# Altium schematic symbol library jlcpcb_2025_04_capacitors_extended_1206.schlib: 2503 symbols (part 7 of 14) (continued)
## CC1206KKX7RBBB222
designator C?  Capacitance: 2.2nF  (hidden comment: *)
Capacitor, Ceramic (MLCC), 2.2nF, ±10%, 500V, X7R, ±10%, SMD 1206; Manufacturer: YAGEO; Manufacturer Part Number: CC1206KKX7RBBB222; Package Size: 1206; JLCPCB Basic Part: No; JLCPCB Part Number: C107188; Supplier 1: LCSC; Category: Capacitors - MLCC; Supplier Part Number 1: C107188; Tolerance: ±10%; Voltage Rating: 500V; Temperature Coefficient: X7R; RoHS: Yes; ComponentLink1Description: Datasheet; ComponentLink1URL: https://wmsc.lcsc.com/wmsc/upload/file/pdf/v2/lcsc/2304140030_YAGEO-CC1206KKX7RBBB222_C107188.pdf; ComponentLink2Description: JLCPCB Part URL; ComponentLink2URL: https://jlcpcb.com/partdetail/C107188; ComponentLink3Description: LCSC Part URL; ComponentLink3URL: https://lcsc.com/product-detail/Multilayer-Ceramic-Capacitors-MLCC---SMD-SMT_YAGEO-YAGEO-CC1206KKX7RBBB222_C107188.html
footprint CAP-1206 (1206 (3216M) Capacitor)
pins: 1, 2

## CC1206KKX7RBBB223
designator C?  Capacitance: 22nF  (hidden comment: *)
Capacitor, Ceramic (MLCC), 22nF, ±10%, 500V, X7R, ±10%, SMD 1206; Manufacturer: YAGEO; Manufacturer Part Number: CC1206KKX7RBBB223; Package Size: 1206; JLCPCB Basic Part: No; JLCPCB Part Number: C326702; Supplier 1: LCSC; Category: Capacitors - MLCC; Supplier Part Number 1: C326702; Tolerance: ±10%; Voltage Rating: 500V; Temperature Coefficient: X7R; RoHS: Yes; ComponentLink1Description: Datasheet; ComponentLink1URL: https://wmsc.lcsc.com/wmsc/upload/file/pdf/v2/lcsc/1811141240_YAGEO-CC1206KKX7RBBB223_C326702.pdf; ComponentLink2Description: JLCPCB Part URL; ComponentLink2URL: https://jlcpcb.com/partdetail/C326702; ComponentLink3Description: LCSC Part URL; ComponentLink3URL: https://lcsc.com/product-detail/Multilayer-Ceramic-Capacitors-MLCC---SMD-SMT_YAGEO-YAGEO-CC1206KKX7RBBB223_C326702.html
footprint CAP-1206 (1206 (3216M) Capacitor)
pins: 1, 2

## CC1206KKX7RBBB331
designator C?  Capacitance: 330pF  (hidden comment: *)
Capacitor, Ceramic (MLCC), 330pF, ±10%, 500V, X7R, ±10%, SMD 1206; Manufacturer: YAGEO; Manufacturer Part Number: CC1206KKX7RBBB331; Package Size: 1206; JLCPCB Basic Part: No; JLCPCB Part Number: C113896; Supplier 1: LCSC; Category: Capacitors - MLCC; Supplier Part Number 1: C113896; Tolerance: ±10%; Voltage Rating: 500V; Temperature Coefficient: X7R; RoHS: Yes; ComponentLink1Description: Datasheet; ComponentLink1URL: https://wmsc.lcsc.com/wmsc/upload/file/pdf/v2/lcsc/2304140030_YAGEO-CC1206KKX7RBBB331_C113896.pdf; ComponentLink2Description: JLCPCB Part URL; ComponentLink2URL: https://jlcpcb.com/partdetail/C113896; ComponentLink3Description: LCSC Part URL; ComponentLink3URL: https://lcsc.com/product-detail/Multilayer-Ceramic-Capacitors-MLCC---SMD-SMT_YAGEO-YAGEO-CC1206KKX7RBBB331_C113896.html
footprint CAP-1206 (1206 (3216M) Capacitor)
pins: 1, 2

## CC1206KKX7RBBB332
designator C?  Capacitance: 3.3nF  (hidden comment: *)
Capacitor, Ceramic (MLCC), 3.3nF, ±10%, 500V, X7R, ±10%, SMD 1206; Manufacturer: YAGEO; Manufacturer Part Number: CC1206KKX7RBBB332; Package Size: 1206; JLCPCB Basic Part: No; JLCPCB Part Number: C113897; Supplier 1: LCSC; Category: Capacitors - MLCC; Supplier Part Number 1: C113897; Tolerance: ±10%; Voltage Rating: 500V; Temperature Coefficient: X7R; RoHS: Yes; ComponentLink1Description: Datasheet; ComponentLink1URL: https://wmsc.lcsc.com/wmsc/upload/file/pdf/v2/lcsc/2304140030_YAGEO-CC1206KKX7RBBB332_C113897.pdf; ComponentLink2Description: JLCPCB Part URL; ComponentLink2URL: https://jlcpcb.com/partdetail/C113897; ComponentLink3Description: LCSC Part URL; ComponentLink3URL: https://lcsc.com/product-detail/Multilayer-Ceramic-Capacitors-MLCC---SMD-SMT_YAGEO-YAGEO-CC1206KKX7RBBB332_C113897.html
footprint CAP-1206 (1206 (3216M) Capacitor)
pins: 1, 2

## CC1206KKX7RBBB333
designator C?  Capacitance: 33nF  (hidden comment: *)
Capacitor, Ceramic (MLCC), 33nF, ±10%, 500V, X7R, ±10%, SMD 1206; Manufacturer: YAGEO; Manufacturer Part Number: CC1206KKX7RBBB333; Package Size: 1206; JLCPCB Basic Part: No; JLCPCB Part Number: C107189; Supplier 1: LCSC; Category: Capacitors - MLCC; Supplier Part Number 1: C107189; Tolerance: ±10%; Voltage Rating: 500V; Temperature Coefficient: X7R; RoHS: Yes; ComponentLink1Description: Datasheet; ComponentLink1URL: https://wmsc.lcsc.com/wmsc/upload/file/pdf/v2/lcsc/2304140030_YAGEO-CC1206KKX7RBBB333_C107189.pdf; ComponentLink2Description: JLCPCB Part URL; ComponentLink2URL: https://jlcpcb.com/partdetail/C107189; ComponentLink3Description: LCSC Part URL; ComponentLink3URL: https://lcsc.com/product-detail/Multilayer-Ceramic-Capacitors-MLCC---SMD-SMT_YAGEO-YAGEO-CC1206KKX7RBBB333_C107189.html
footprint CAP-1206 (1206 (3216M) Capacitor)
pins: 1, 2

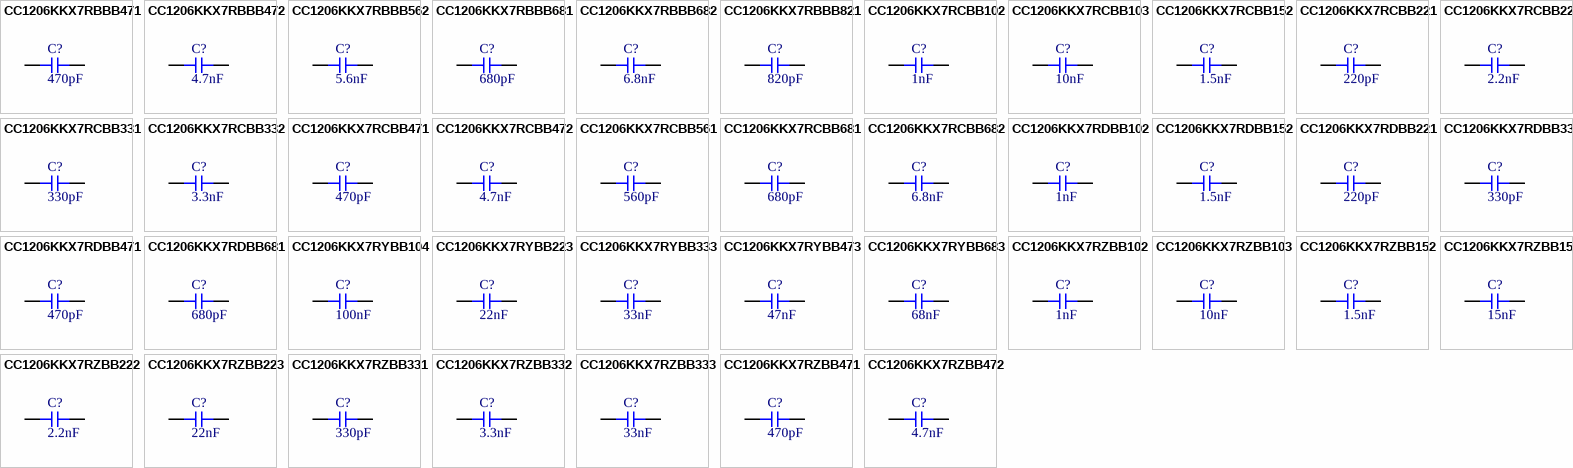
[diagram p31: symbols CC1206KKX7RBBB471 to CC1206KKX7RZBB472]

## CC1206KKX7RBBB471
designator C?  Capacitance: 470pF  (hidden comment: *)
Capacitor, Ceramic (MLCC), 470pF, ±10%, 500V, X7R, ±10%, SMD 1206; Manufacturer: YAGEO; Manufacturer Part Number: CC1206KKX7RBBB471; Package Size: 1206; JLCPCB Basic Part: No; JLCPCB Part Number: C513662; Supplier 1: LCSC; Category: Capacitors - MLCC; Supplier Part Number 1: C513662; Tolerance: ±10%; Voltage Rating: 500V; Temperature Coefficient: X7R; RoHS: Yes; ComponentLink1Description: Datasheet; ComponentLink1URL: https://wmsc.lcsc.com/wmsc/upload/file/pdf/v2/lcsc/2004231433_YAGEO-CC1206KKX7RBBB471_C513662.pdf; ComponentLink2Description: JLCPCB Part URL; ComponentLink2URL: https://jlcpcb.com/partdetail/C513662; ComponentLink3Description: LCSC Part URL; ComponentLink3URL: https://lcsc.com/product-detail/Multilayer-Ceramic-Capacitors-MLCC---SMD-SMT_YAGEO-YAGEO-CC1206KKX7RBBB471_C513662.html
footprint CAP-1206 (1206 (3216M) Capacitor)
pins: 1, 2

## CC1206KKX7RBBB472
designator C?  Capacitance: 4.7nF  (hidden comment: *)
Capacitor, Ceramic (MLCC), 4.7nF, ±10%, 500V, X7R, ±10%, SMD 1206; Manufacturer: YAGEO; Manufacturer Part Number: CC1206KKX7RBBB472; Package Size: 1206; JLCPCB Basic Part: No; JLCPCB Part Number: C107190; Supplier 1: LCSC; Category: Capacitors - MLCC; Supplier Part Number 1: C107190; Tolerance: ±10%; Voltage Rating: 500V; Temperature Coefficient: X7R; RoHS: Yes; ComponentLink1Description: Datasheet; ComponentLink1URL: https://wmsc.lcsc.com/wmsc/upload/file/pdf/v2/lcsc/2304140030_YAGEO-CC1206KKX7RBBB472_C107190.pdf; ComponentLink2Description: JLCPCB Part URL; ComponentLink2URL: https://jlcpcb.com/partdetail/C107190; ComponentLink3Description: LCSC Part URL; ComponentLink3URL: https://lcsc.com/product-detail/Multilayer-Ceramic-Capacitors-MLCC---SMD-SMT_YAGEO-YAGEO-CC1206KKX7RBBB472_C107190.html
footprint CAP-1206 (1206 (3216M) Capacitor)
pins: 1, 2

## CC1206KKX7RBBB562
designator C?  Capacitance: 5.6nF  (hidden comment: *)
Capacitor, Ceramic (MLCC), 5.6nF, ±10%, 500V, X7R, ±10%, SMD 1206; Manufacturer: YAGEO; Manufacturer Part Number: CC1206KKX7RBBB562; Package Size: 1206; JLCPCB Basic Part: No; JLCPCB Part Number: C3834562; Supplier 1: LCSC; Category: Capacitors - MLCC; Supplier Part Number 1: C3834562; Tolerance: ±10%; Voltage Rating: 500V; Temperature Coefficient: X7R; RoHS: Yes; ComponentLink1Description: Datasheet; ComponentLink1URL: https://wmsc.lcsc.com/wmsc/upload/file/pdf/v2/lcsc/2311211121_YAGEO-CC1206KKX7RBBB562_C3834562.pdf; ComponentLink2Description: JLCPCB Part URL; ComponentLink2URL: https://jlcpcb.com/partdetail/C3834562; ComponentLink3Description: LCSC Part URL; ComponentLink3URL: https://lcsc.com/product-detail/Multilayer-Ceramic-Capacitors-MLCC---SMD-SMT_YAGEO-YAGEO-CC1206KKX7RBBB562_C3834562.html
footprint CAP-1206 (1206 (3216M) Capacitor)
pins: 1, 2

## CC1206KKX7RBBB681
designator C?  Capacitance: 680pF  (hidden comment: *)
Capacitor, Ceramic (MLCC), 680pF, ±10%, 500V, X7R, ±10%, SMD 1206; Manufacturer: YAGEO; Manufacturer Part Number: CC1206KKX7RBBB681; Package Size: 1206; JLCPCB Basic Part: No; JLCPCB Part Number: C326771; Supplier 1: LCSC; Category: Capacitors - MLCC; Supplier Part Number 1: C326771; Tolerance: ±10%; Voltage Rating: 500V; Temperature Coefficient: X7R; RoHS: Yes; ComponentLink1Description: Datasheet; ComponentLink1URL: https://wmsc.lcsc.com/wmsc/upload/file/pdf/v2/lcsc/1811141241_YAGEO-CC1206KKX7RBBB681_C326771.pdf; ComponentLink2Description: JLCPCB Part URL; ComponentLink2URL: https://jlcpcb.com/partdetail/C326771; ComponentLink3Description: LCSC Part URL; ComponentLink3URL: https://lcsc.com/product-detail/Multilayer-Ceramic-Capacitors-MLCC---SMD-SMT_YAGEO-YAGEO-CC1206KKX7RBBB681_C326771.html
footprint CAP-1206 (1206 (3216M) Capacitor)
pins: 1, 2

## CC1206KKX7RBBB682
designator C?  Capacitance: 6.8nF  (hidden comment: *)
Capacitor, Ceramic (MLCC), 6.8nF, ±10%, 500V, X7R, ±10%, SMD 1206; Manufacturer: YAGEO; Manufacturer Part Number: CC1206KKX7RBBB682; Package Size: 1206; JLCPCB Basic Part: No; JLCPCB Part Number: C577221; Supplier 1: LCSC; Category: Capacitors - MLCC; Supplier Part Number 1: C577221; Tolerance: ±10%; Voltage Rating: 500V; Temperature Coefficient: X7R; RoHS: Yes; ComponentLink1Description: Datasheet; ComponentLink1URL: https://wmsc.lcsc.com/wmsc/upload/file/pdf/v2/lcsc/2304140030_YAGEO-CC1206KKX7RBBB682_C577221.pdf; ComponentLink2Description: JLCPCB Part URL; ComponentLink2URL: https://jlcpcb.com/partdetail/C577221; ComponentLink3Description: LCSC Part URL; ComponentLink3URL: https://lcsc.com/product-detail/Multilayer-Ceramic-Capacitors-MLCC---SMD-SMT_YAGEO-YAGEO-CC1206KKX7RBBB682_C577221.html
footprint CAP-1206 (1206 (3216M) Capacitor)
pins: 1, 2

## CC1206KKX7RBBB821
designator C?  Capacitance: 820pF  (hidden comment: *)
Capacitor, Ceramic (MLCC), 820pF, ±10%, 500V, X7R, ±10%, SMD 1206; Manufacturer: YAGEO; Manufacturer Part Number: CC1206KKX7RBBB821; Package Size: 1206; JLCPCB Basic Part: No; JLCPCB Part Number: C326993; Supplier 1: LCSC; Category: Capacitors - MLCC; Supplier Part Number 1: C326993; Tolerance: ±10%; Voltage Rating: 500V; Temperature Coefficient: X7R; RoHS: Yes; ComponentLink1Description: Datasheet; ComponentLink1URL: https://wmsc.lcsc.com/wmsc/upload/file/pdf/v2/lcsc/2311211121_YAGEO-CC1206KKX7RBBB821_C326993.pdf; ComponentLink2Description: JLCPCB Part URL; ComponentLink2URL: https://jlcpcb.com/partdetail/C326993; ComponentLink3Description: LCSC Part URL; ComponentLink3URL: https://lcsc.com/product-detail/Multilayer-Ceramic-Capacitors-MLCC---SMD-SMT_YAGEO-YAGEO-CC1206KKX7RBBB821_C326993.html
footprint CAP-1206 (1206 (3216M) Capacitor)
pins: 1, 2

## CC1206KKX7RCBB102
designator C?  Capacitance: 1nF  (hidden comment: *)
Capacitor, Ceramic (MLCC), 1nF, ±10%, 1kV, X7R, ±10%, SMD 1206; Manufacturer: YAGEO; Manufacturer Part Number: CC1206KKX7RCBB102; Package Size: 1206; JLCPCB Basic Part: No; JLCPCB Part Number: C107191; Supplier 1: LCSC; Category: Capacitors - MLCC; Supplier Part Number 1: C107191; Tolerance: ±10%; Voltage Rating: 1kV; Temperature Coefficient: X7R; RoHS: Yes; ComponentLink1Description: Datasheet; ComponentLink1URL: https://wmsc.lcsc.com/wmsc/upload/file/pdf/v2/lcsc/2304140030_YAGEO-CC1206KKX7RCBB102_C107191.pdf; ComponentLink2Description: JLCPCB Part URL; ComponentLink2URL: https://jlcpcb.com/partdetail/C107191; ComponentLink3Description: LCSC Part URL; ComponentLink3URL: https://lcsc.com/product-detail/Multilayer-Ceramic-Capacitors-MLCC---SMD-SMT_YAGEO-YAGEO-CC1206KKX7RCBB102_C107191.html
footprint CAP-1206 (1206 (3216M) Capacitor)
pins: 1, 2

## CC1206KKX7RCBB103
designator C?  Capacitance: 10nF  (hidden comment: *)
Capacitor, Ceramic (MLCC), 10nF, ±10%, 1kV, X7R, ±10%, SMD 1206; Manufacturer: YAGEO; Manufacturer Part Number: CC1206KKX7RCBB103; Package Size: 1206; JLCPCB Basic Part: No; JLCPCB Part Number: C107192; Supplier 1: LCSC; Category: Capacitors - MLCC; Supplier Part Number 1: C107192; Tolerance: ±10%; Voltage Rating: 1kV; Temperature Coefficient: X7R; RoHS: Yes; ComponentLink1Description: Datasheet; ComponentLink1URL: https://wmsc.lcsc.com/wmsc/upload/file/pdf/v2/lcsc/2304140030_YAGEO-CC1206KKX7RCBB103_C107192.pdf; ComponentLink2Description: JLCPCB Part URL; ComponentLink2URL: https://jlcpcb.com/partdetail/C107192; ComponentLink3Description: LCSC Part URL; ComponentLink3URL: https://lcsc.com/product-detail/Multilayer-Ceramic-Capacitors-MLCC---SMD-SMT_YAGEO-YAGEO-CC1206KKX7RCBB103_C107192.html
footprint CAP-1206 (1206 (3216M) Capacitor)
pins: 1, 2

## CC1206KKX7RCBB152
designator C?  Capacitance: 1.5nF  (hidden comment: *)
Capacitor, Ceramic (MLCC), 1.5nF, ±10%, 1kV, X7R, ±10%, SMD 1206; Manufacturer: YAGEO; Manufacturer Part Number: CC1206KKX7RCBB152; Package Size: 1206; JLCPCB Basic Part: No; JLCPCB Part Number: C513659; Supplier 1: LCSC; Category: Capacitors - MLCC; Supplier Part Number 1: C513659; Tolerance: ±10%; Voltage Rating: 1kV; Temperature Coefficient: X7R; RoHS: Yes; ComponentLink1Description: Datasheet; ComponentLink1URL: https://wmsc.lcsc.com/wmsc/upload/file/pdf/v2/lcsc/2005142208_YAGEO-CC1206KKX7RCBB152_C513659.pdf; ComponentLink2Description: JLCPCB Part URL; ComponentLink2URL: https://jlcpcb.com/partdetail/C513659; ComponentLink3Description: LCSC Part URL; ComponentLink3URL: https://lcsc.com/product-detail/Multilayer-Ceramic-Capacitors-MLCC---SMD-SMT_YAGEO-YAGEO-CC1206KKX7RCBB152_C513659.html
footprint CAP-1206 (1206 (3216M) Capacitor)
pins: 1, 2

## CC1206KKX7RCBB221
designator C?  Capacitance: 220pF  (hidden comment: *)
Capacitor, Ceramic (MLCC), 220pF, ±10%, 1kV, X7R, ±10%, SMD 1206; Manufacturer: YAGEO; Manufacturer Part Number: CC1206KKX7RCBB221; Package Size: 1206; JLCPCB Basic Part: No; JLCPCB Part Number: C107193; Supplier 1: LCSC; Category: Capacitors - MLCC; Supplier Part Number 1: C107193; Tolerance: ±10%; Voltage Rating: 1kV; Temperature Coefficient: X7R; RoHS: Yes; ComponentLink1Description: Datasheet; ComponentLink1URL: https://wmsc.lcsc.com/wmsc/upload/file/pdf/v2/lcsc/2304140030_YAGEO-CC1206KKX7RCBB221_C107193.pdf; ComponentLink2Description: JLCPCB Part URL; ComponentLink2URL: https://jlcpcb.com/partdetail/C107193; ComponentLink3Description: LCSC Part URL; ComponentLink3URL: https://lcsc.com/product-detail/Multilayer-Ceramic-Capacitors-MLCC---SMD-SMT_YAGEO-YAGEO-CC1206KKX7RCBB221_C107193.html
footprint CAP-1206 (1206 (3216M) Capacitor)
pins: 1, 2

## CC1206KKX7RCBB222
designator C?  Capacitance: 2.2nF  (hidden comment: *)
Capacitor, Ceramic (MLCC), 2.2nF, ±10%, 1kV, X7R, ±10%, SMD 1206; Manufacturer: YAGEO; Manufacturer Part Number: CC1206KKX7RCBB222; Package Size: 1206; JLCPCB Basic Part: No; JLCPCB Part Number: C107194; Supplier 1: LCSC; Category: Capacitors - MLCC; Supplier Part Number 1: C107194; Tolerance: ±10%; Voltage Rating: 1kV; Temperature Coefficient: X7R; RoHS: Yes; ComponentLink1Description: Datasheet; ComponentLink1URL: https://wmsc.lcsc.com/wmsc/upload/file/pdf/v2/lcsc/2304140030_YAGEO-CC1206KKX7RCBB222_C107194.pdf; ComponentLink2Description: JLCPCB Part URL; ComponentLink2URL: https://jlcpcb.com/partdetail/C107194; ComponentLink3Description: LCSC Part URL; ComponentLink3URL: https://lcsc.com/product-detail/Multilayer-Ceramic-Capacitors-MLCC---SMD-SMT_YAGEO-YAGEO-CC1206KKX7RCBB222_C107194.html
footprint CAP-1206 (1206 (3216M) Capacitor)
pins: 1, 2

## CC1206KKX7RCBB331
designator C?  Capacitance: 330pF  (hidden comment: *)
Capacitor, Ceramic (MLCC), 330pF, ±10%, 1kV, X7R, ±10%, SMD 1206; Manufacturer: YAGEO; Manufacturer Part Number: CC1206KKX7RCBB331; Package Size: 1206; JLCPCB Basic Part: No; JLCPCB Part Number: C107195; Supplier 1: LCSC; Category: Capacitors - MLCC; Supplier Part Number 1: C107195; Tolerance: ±10%; Voltage Rating: 1kV; Temperature Coefficient: X7R; RoHS: Yes; ComponentLink1Description: Datasheet; ComponentLink1URL: https://wmsc.lcsc.com/wmsc/upload/file/pdf/v2/lcsc/2304140030_YAGEO-CC1206KKX7RCBB331_C107195.pdf; ComponentLink2Description: JLCPCB Part URL; ComponentLink2URL: https://jlcpcb.com/partdetail/C107195; ComponentLink3Description: LCSC Part URL; ComponentLink3URL: https://lcsc.com/product-detail/Multilayer-Ceramic-Capacitors-MLCC---SMD-SMT_YAGEO-YAGEO-CC1206KKX7RCBB331_C107195.html
footprint CAP-1206 (1206 (3216M) Capacitor)
pins: 1, 2

## CC1206KKX7RCBB332
designator C?  Capacitance: 3.3nF  (hidden comment: *)
Capacitor, Ceramic (MLCC), 3.3nF, ±10%, 1kV, X7R, ±10%, SMD 1206; Manufacturer: YAGEO; Manufacturer Part Number: CC1206KKX7RCBB332; Package Size: 1206; JLCPCB Basic Part: No; JLCPCB Part Number: C107196; Supplier 1: LCSC; Category: Capacitors - MLCC; Supplier Part Number 1: C107196; Tolerance: ±10%; Voltage Rating: 1kV; Temperature Coefficient: X7R; RoHS: Yes; ComponentLink1Description: Datasheet; ComponentLink1URL: https://wmsc.lcsc.com/wmsc/upload/file/pdf/v2/lcsc/2304140030_YAGEO-CC1206KKX7RCBB332_C107196.pdf; ComponentLink2Description: JLCPCB Part URL; ComponentLink2URL: https://jlcpcb.com/partdetail/C107196; ComponentLink3Description: LCSC Part URL; ComponentLink3URL: https://lcsc.com/product-detail/Multilayer-Ceramic-Capacitors-MLCC---SMD-SMT_YAGEO-YAGEO-CC1206KKX7RCBB332_C107196.html
footprint CAP-1206 (1206 (3216M) Capacitor)
pins: 1, 2

## CC1206KKX7RCBB471
designator C?  Capacitance: 470pF  (hidden comment: *)
Capacitor, Ceramic (MLCC), 470pF, ±10%, 1kV, X7R, ±10%, SMD 1206; Manufacturer: YAGEO; Manufacturer Part Number: CC1206KKX7RCBB471; Package Size: 1206; JLCPCB Basic Part: No; JLCPCB Part Number: C107197; Supplier 1: LCSC; Category: Capacitors - MLCC; Supplier Part Number 1: C107197; Tolerance: ±10%; Voltage Rating: 1kV; Temperature Coefficient: X7R; RoHS: Yes; ComponentLink1Description: Datasheet; ComponentLink1URL: https://wmsc.lcsc.com/wmsc/upload/file/pdf/v2/lcsc/2304140030_YAGEO-CC1206KKX7RCBB471_C107197.pdf; ComponentLink2Description: JLCPCB Part URL; ComponentLink2URL: https://jlcpcb.com/partdetail/C107197; ComponentLink3Description: LCSC Part URL; ComponentLink3URL: https://lcsc.com/product-detail/Multilayer-Ceramic-Capacitors-MLCC---SMD-SMT_YAGEO-YAGEO-CC1206KKX7RCBB471_C107197.html
footprint CAP-1206 (1206 (3216M) Capacitor)
pins: 1, 2

## CC1206KKX7RCBB472
designator C?  Capacitance: 4.7nF  (hidden comment: *)
Capacitor, Ceramic (MLCC), 4.7nF, ±10%, 1kV, X7R, ±10%, SMD 1206; Manufacturer: YAGEO; Manufacturer Part Number: CC1206KKX7RCBB472; Package Size: 1206; JLCPCB Basic Part: No; JLCPCB Part Number: C107198; Supplier 1: LCSC; Category: Capacitors - MLCC; Supplier Part Number 1: C107198; Tolerance: ±10%; Voltage Rating: 1kV; Temperature Coefficient: X7R; RoHS: Yes; ComponentLink1Description: Datasheet; ComponentLink1URL: https://wmsc.lcsc.com/wmsc/upload/file/pdf/v2/lcsc/2304140030_YAGEO-CC1206KKX7RCBB472_C107198.pdf; ComponentLink2Description: JLCPCB Part URL; ComponentLink2URL: https://jlcpcb.com/partdetail/C107198; ComponentLink3Description: LCSC Part URL; ComponentLink3URL: https://lcsc.com/product-detail/Multilayer-Ceramic-Capacitors-MLCC---SMD-SMT_YAGEO-YAGEO-CC1206KKX7RCBB472_C107198.html
footprint CAP-1206 (1206 (3216M) Capacitor)
pins: 1, 2

## CC1206KKX7RCBB561
designator C?  Capacitance: 560pF  (hidden comment: *)
Capacitor, Ceramic (MLCC), 560pF, ±10%, 1kV, X7R, ±10%, SMD 1206; Manufacturer: YAGEO; Manufacturer Part Number: CC1206KKX7RCBB561; Package Size: 1206; JLCPCB Basic Part: No; JLCPCB Part Number: C113898; Supplier 1: LCSC; Category: Capacitors - MLCC; Supplier Part Number 1: C113898; Tolerance: ±10%; Voltage Rating: 1kV; Temperature Coefficient: X7R; RoHS: Yes; ComponentLink1Description: Datasheet; ComponentLink1URL: https://wmsc.lcsc.com/wmsc/upload/file/pdf/v2/lcsc/2304140030_YAGEO-CC1206KKX7RCBB561_C113898.pdf; ComponentLink2Description: JLCPCB Part URL; ComponentLink2URL: https://jlcpcb.com/partdetail/C113898; ComponentLink3Description: LCSC Part URL; ComponentLink3URL: https://lcsc.com/product-detail/Multilayer-Ceramic-Capacitors-MLCC---SMD-SMT_YAGEO-YAGEO-CC1206KKX7RCBB561_C113898.html
footprint CAP-1206 (1206 (3216M) Capacitor)
pins: 1, 2

## CC1206KKX7RCBB681
designator C?  Capacitance: 680pF  (hidden comment: *)
Capacitor, Ceramic (MLCC), 680pF, ±10%, 1kV, X7R, ±10%, SMD 1206; Manufacturer: YAGEO; Manufacturer Part Number: CC1206KKX7RCBB681; Package Size: 1206; JLCPCB Basic Part: No; JLCPCB Part Number: C107199; Supplier 1: LCSC; Category: Capacitors - MLCC; Supplier Part Number 1: C107199; Tolerance: ±10%; Voltage Rating: 1kV; Temperature Coefficient: X7R; RoHS: Yes; ComponentLink1Description: Datasheet; ComponentLink1URL: https://wmsc.lcsc.com/wmsc/upload/file/pdf/v2/lcsc/2304140030_YAGEO-CC1206KKX7RCBB681_C107199.pdf; ComponentLink2Description: JLCPCB Part URL; ComponentLink2URL: https://jlcpcb.com/partdetail/C107199; ComponentLink3Description: LCSC Part URL; ComponentLink3URL: https://lcsc.com/product-detail/Multilayer-Ceramic-Capacitors-MLCC---SMD-SMT_YAGEO-YAGEO-CC1206KKX7RCBB681_C107199.html
footprint CAP-1206 (1206 (3216M) Capacitor)
pins: 1, 2

## CC1206KKX7RCBB682
designator C?  Capacitance: 6.8nF  (hidden comment: *)
Capacitor, Ceramic (MLCC), 6.8nF, ±10%, 1kV, X7R, ±10%, SMD 1206; Manufacturer: YAGEO; Manufacturer Part Number: CC1206KKX7RCBB682; Package Size: 1206; JLCPCB Basic Part: No; JLCPCB Part Number: C107200; Supplier 1: LCSC; Category: Capacitors - MLCC; Supplier Part Number 1: C107200; Tolerance: ±10%; Voltage Rating: 1kV; Temperature Coefficient: X7R; RoHS: Yes; ComponentLink1Description: Datasheet; ComponentLink1URL: https://wmsc.lcsc.com/wmsc/upload/file/pdf/v2/lcsc/2304140030_YAGEO-CC1206KKX7RCBB682_C107200.pdf; ComponentLink2Description: JLCPCB Part URL; ComponentLink2URL: https://jlcpcb.com/partdetail/C107200; ComponentLink3Description: LCSC Part URL; ComponentLink3URL: https://lcsc.com/product-detail/Multilayer-Ceramic-Capacitors-MLCC---SMD-SMT_YAGEO-YAGEO-CC1206KKX7RCBB682_C107200.html
footprint CAP-1206 (1206 (3216M) Capacitor)
pins: 1, 2

## CC1206KKX7RDBB102
designator C?  Capacitance: 1nF  (hidden comment: *)
Capacitor, Ceramic (MLCC), 1nF, ±10%, 2kV, X7R, ±10%, SMD 1206; Manufacturer: YAGEO; Manufacturer Part Number: CC1206KKX7RDBB102; Package Size: 1206; JLCPCB Basic Part: No; JLCPCB Part Number: C23631; Supplier 1: LCSC; Category: Capacitors - MLCC; Supplier Part Number 1: C23631; Tolerance: ±10%; Voltage Rating: 2kV; Temperature Coefficient: X7R; RoHS: Yes; ComponentLink1Description: Datasheet; ComponentLink1URL: https://wmsc.lcsc.com/wmsc/upload/file/pdf/v2/lcsc/2304140030_YAGEO-CC1206KKX7RDBB102_C23631.pdf; ComponentLink2Description: JLCPCB Part URL; ComponentLink2URL: https://jlcpcb.com/partdetail/C23631; ComponentLink3Description: LCSC Part URL; ComponentLink3URL: https://lcsc.com/product-detail/Multilayer-Ceramic-Capacitors-MLCC---SMD-SMT_YAGEO-YAGEO-CC1206KKX7RDBB102_C23631.html
footprint CAP-1206 (1206 (3216M) Capacitor)
pins: 1, 2

## CC1206KKX7RDBB152
designator C?  Capacitance: 1.5nF  (hidden comment: *)
Capacitor, Ceramic (MLCC), 1.5nF, ±10%, 2kV, X7R, ±10%, SMD 1206; Manufacturer: YAGEO; Manufacturer Part Number: CC1206KKX7RDBB152; Package Size: 1206; JLCPCB Basic Part: No; JLCPCB Part Number: C527335; Supplier 1: LCSC; Category: Capacitors - MLCC; Supplier Part Number 1: C527335; Tolerance: ±10%; Voltage Rating: 2kV; Temperature Coefficient: X7R; RoHS: Yes; ComponentLink1Description: Datasheet; ComponentLink1URL: https://wmsc.lcsc.com/wmsc/upload/file/pdf/v2/lcsc/2005262135_YAGEO-CC1206KKX7RDBB152_C527335.pdf; ComponentLink2Description: JLCPCB Part URL; ComponentLink2URL: https://jlcpcb.com/partdetail/C527335; ComponentLink3Description: LCSC Part URL; ComponentLink3URL: https://lcsc.com/product-detail/Multilayer-Ceramic-Capacitors-MLCC---SMD-SMT_YAGEO-YAGEO-CC1206KKX7RDBB152_C527335.html
footprint CAP-1206 (1206 (3216M) Capacitor)
pins: 1, 2

## CC1206KKX7RDBB221
designator C?  Capacitance: 220pF  (hidden comment: *)
Capacitor, Ceramic (MLCC), 220pF, ±10%, 2kV, X7R, ±10%, SMD 1206; Manufacturer: YAGEO; Manufacturer Part Number: CC1206KKX7RDBB221; Package Size: 1206; JLCPCB Basic Part: No; JLCPCB Part Number: C527336; Supplier 1: LCSC; Category: Capacitors - MLCC; Supplier Part Number 1: C527336; Tolerance: ±10%; Voltage Rating: 2kV; Temperature Coefficient: X7R; RoHS: Yes; ComponentLink1Description: Datasheet; ComponentLink1URL: https://wmsc.lcsc.com/wmsc/upload/file/pdf/v2/lcsc/2006241835_YAGEO-CC1206KKX7RDBB221_C527336.pdf; ComponentLink2Description: JLCPCB Part URL; ComponentLink2URL: https://jlcpcb.com/partdetail/C527336; ComponentLink3Description: LCSC Part URL; ComponentLink3URL: https://lcsc.com/product-detail/Multilayer-Ceramic-Capacitors-MLCC---SMD-SMT_YAGEO-YAGEO-CC1206KKX7RDBB221_C527336.html
footprint CAP-1206 (1206 (3216M) Capacitor)
pins: 1, 2

## CC1206KKX7RDBB331
designator C?  Capacitance: 330pF  (hidden comment: *)
Capacitor, Ceramic (MLCC), 330pF, ±10%, 2kV, X7R, ±10%, SMD 1206; Manufacturer: YAGEO; Manufacturer Part Number: CC1206KKX7RDBB331; Package Size: 1206; JLCPCB Basic Part: No; JLCPCB Part Number: C282080; Supplier 1: LCSC; Category: Capacitors - MLCC; Supplier Part Number 1: C282080; Tolerance: ±10%; Voltage Rating: 2kV; Temperature Coefficient: X7R; RoHS: Yes; ComponentLink1Description: Datasheet; ComponentLink1URL: https://wmsc.lcsc.com/wmsc/upload/file/pdf/v2/lcsc/1810241125_YAGEO-CC1206KKX7RDBB331_C282080.pdf; ComponentLink2Description: JLCPCB Part URL; ComponentLink2URL: https://jlcpcb.com/partdetail/C282080; ComponentLink3Description: LCSC Part URL; ComponentLink3URL: https://lcsc.com/product-detail/Multilayer-Ceramic-Capacitors-MLCC---SMD-SMT_YAGEO-YAGEO-CC1206KKX7RDBB331_C282080.html
footprint CAP-1206 (1206 (3216M) Capacitor)
pins: 1, 2

## CC1206KKX7RDBB471
designator C?  Capacitance: 470pF  (hidden comment: *)
Capacitor, Ceramic (MLCC), 470pF, ±10%, 2kV, X7R, ±10%, SMD 1206; Manufacturer: YAGEO; Manufacturer Part Number: CC1206KKX7RDBB471; Package Size: 1206; JLCPCB Basic Part: No; JLCPCB Part Number: C282081; Supplier 1: LCSC; Category: Capacitors - MLCC; Supplier Part Number 1: C282081; Tolerance: ±10%; Voltage Rating: 2kV; Temperature Coefficient: X7R; RoHS: Yes; ComponentLink1Description: Datasheet; ComponentLink1URL: https://wmsc.lcsc.com/wmsc/upload/file/pdf/v2/lcsc/2311211121_YAGEO-CC1206KKX7RDBB471_C282081.pdf; ComponentLink2Description: JLCPCB Part URL; ComponentLink2URL: https://jlcpcb.com/partdetail/C282081; ComponentLink3Description: LCSC Part URL; ComponentLink3URL: https://lcsc.com/product-detail/Multilayer-Ceramic-Capacitors-MLCC---SMD-SMT_YAGEO-YAGEO-CC1206KKX7RDBB471_C282081.html
footprint CAP-1206 (1206 (3216M) Capacitor)
pins: 1, 2

## CC1206KKX7RDBB681
designator C?  Capacitance: 680pF  (hidden comment: *)
Capacitor, Ceramic (MLCC), 680pF, ±10%, 2kV, X7R, ±10%, SMD 1206; Manufacturer: YAGEO; Manufacturer Part Number: CC1206KKX7RDBB681; Package Size: 1206; JLCPCB Basic Part: No; JLCPCB Part Number: C577226; Supplier 1: LCSC; Category: Capacitors - MLCC; Supplier Part Number 1: C577226; Tolerance: ±10%; Voltage Rating: 2kV; Temperature Coefficient: X7R; RoHS: Yes; ComponentLink1Description: Datasheet; ComponentLink1URL: https://wmsc.lcsc.com/wmsc/upload/file/pdf/v2/lcsc/2205191730_YAGEO-CC1206KKX7RDBB681_C577226.pdf; ComponentLink2Description: JLCPCB Part URL; ComponentLink2URL: https://jlcpcb.com/partdetail/C577226; ComponentLink3Description: LCSC Part URL; ComponentLink3URL: https://lcsc.com/product-detail/Multilayer-Ceramic-Capacitors-MLCC---SMD-SMT_YAGEO-YAGEO-CC1206KKX7RDBB681_C577226.html
footprint CAP-1206 (1206 (3216M) Capacitor)
pins: 1, 2

## CC1206KKX7RYBB104
designator C?  Capacitance: 100nF  (hidden comment: *)
Capacitor, Ceramic (MLCC), 100nF, ±10%, 250V, X7R, ±10%, SMD 1206; Manufacturer: YAGEO; Manufacturer Part Number: CC1206KKX7RYBB104; Package Size: 1206; JLCPCB Basic Part: No; JLCPCB Part Number: C106241; Supplier 1: LCSC; Category: Capacitors - MLCC; Supplier Part Number 1: C106241; Tolerance: ±10%; Voltage Rating: 250V; Temperature Coefficient: X7R; RoHS: Yes; ComponentLink1Description: Datasheet; ComponentLink1URL: https://wmsc.lcsc.com/wmsc/upload/file/pdf/v2/lcsc/2304140030_YAGEO-CC1206KKX7RYBB104_C106241.pdf; ComponentLink2Description: JLCPCB Part URL; ComponentLink2URL: https://jlcpcb.com/partdetail/C106241; ComponentLink3Description: LCSC Part URL; ComponentLink3URL: https://lcsc.com/product-detail/Multilayer-Ceramic-Capacitors-MLCC---SMD-SMT_YAGEO-YAGEO-CC1206KKX7RYBB104_C106241.html
footprint CAP-1206 (1206 (3216M) Capacitor)
pins: 1, 2

## CC1206KKX7RYBB223
designator C?  Capacitance: 22nF  (hidden comment: *)
Capacitor, Ceramic (MLCC), 22nF, ±10%, 250V, X7R, ±10%, SMD 1206; Manufacturer: YAGEO; Manufacturer Part Number: CC1206KKX7RYBB223; Package Size: 1206; JLCPCB Basic Part: No; JLCPCB Part Number: C113899; Supplier 1: LCSC; Category: Capacitors - MLCC; Supplier Part Number 1: C113899; Tolerance: ±10%; Voltage Rating: 250V; Temperature Coefficient: X7R; RoHS: Yes; ComponentLink1Description: Datasheet; ComponentLink1URL: https://wmsc.lcsc.com/wmsc/upload/file/pdf/v2/lcsc/2009211536_YAGEO-CC1206KKX7RYBB223_C113899.pdf; ComponentLink2Description: JLCPCB Part URL; ComponentLink2URL: https://jlcpcb.com/partdetail/C113899; ComponentLink3Description: LCSC Part URL; ComponentLink3URL: https://lcsc.com/product-detail/Multilayer-Ceramic-Capacitors-MLCC---SMD-SMT_YAGEO-YAGEO-CC1206KKX7RYBB223_C113899.html
footprint CAP-1206 (1206 (3216M) Capacitor)
pins: 1, 2

## CC1206KKX7RYBB333
designator C?  Capacitance: 33nF  (hidden comment: *)
Capacitor, Ceramic (MLCC), 33nF, ±10%, 250V, X7R, ±10%, SMD 1206; Manufacturer: YAGEO; Manufacturer Part Number: CC1206KKX7RYBB333; Package Size: 1206; JLCPCB Basic Part: No; JLCPCB Part Number: C513589; Supplier 1: LCSC; Category: Capacitors - MLCC; Supplier Part Number 1: C513589; Tolerance: ±10%; Voltage Rating: 250V; Temperature Coefficient: X7R; RoHS: Yes; ComponentLink1Description: Datasheet; ComponentLink1URL: https://wmsc.lcsc.com/wmsc/upload/file/pdf/v2/lcsc/2005142147_YAGEO-CC1206KKX7RYBB333_C513589.pdf; ComponentLink2Description: JLCPCB Part URL; ComponentLink2URL: https://jlcpcb.com/partdetail/C513589; ComponentLink3Description: LCSC Part URL; ComponentLink3URL: https://lcsc.com/product-detail/Multilayer-Ceramic-Capacitors-MLCC---SMD-SMT_YAGEO-YAGEO-CC1206KKX7RYBB333_C513589.html
footprint CAP-1206 (1206 (3216M) Capacitor)
pins: 1, 2

## CC1206KKX7RYBB473
designator C?  Capacitance: 47nF  (hidden comment: *)
Capacitor, Ceramic (MLCC), 47nF, ±10%, 250V, X7R, ±10%, SMD 1206; Manufacturer: YAGEO; Manufacturer Part Number: CC1206KKX7RYBB473; Package Size: 1206; JLCPCB Basic Part: No; JLCPCB Part Number: C113900; Supplier 1: LCSC; Category: Capacitors - MLCC; Supplier Part Number 1: C113900; Tolerance: ±10%; Voltage Rating: 250V; Temperature Coefficient: X7R; RoHS: Yes; ComponentLink1Description: Datasheet; ComponentLink1URL: https://wmsc.lcsc.com/wmsc/upload/file/pdf/v2/lcsc/2304140030_YAGEO-CC1206KKX7RYBB473_C113900.pdf; ComponentLink2Description: JLCPCB Part URL; ComponentLink2URL: https://jlcpcb.com/partdetail/C113900; ComponentLink3Description: LCSC Part URL; ComponentLink3URL: https://lcsc.com/product-detail/Multilayer-Ceramic-Capacitors-MLCC---SMD-SMT_YAGEO-YAGEO-CC1206KKX7RYBB473_C113900.html
footprint CAP-1206 (1206 (3216M) Capacitor)
pins: 1, 2

## CC1206KKX7RYBB683
designator C?  Capacitance: 68nF  (hidden comment: *)
Capacitor, Ceramic (MLCC), 68nF, ±10%, 250V, X7R, ±10%, SMD 1206; Manufacturer: YAGEO; Manufacturer Part Number: CC1206KKX7RYBB683; Package Size: 1206; JLCPCB Basic Part: No; JLCPCB Part Number: C513585; Supplier 1: LCSC; Category: Capacitors - MLCC; Supplier Part Number 1: C513585; Tolerance: ±10%; Voltage Rating: 250V; Temperature Coefficient: X7R; RoHS: Yes; ComponentLink1Description: Datasheet; ComponentLink1URL: https://wmsc.lcsc.com/wmsc/upload/file/pdf/v2/lcsc/2005142147_YAGEO-CC1206KKX7RYBB683_C513585.pdf; ComponentLink2Description: JLCPCB Part URL; ComponentLink2URL: https://jlcpcb.com/partdetail/C513585; ComponentLink3Description: LCSC Part URL; ComponentLink3URL: https://lcsc.com/product-detail/Multilayer-Ceramic-Capacitors-MLCC---SMD-SMT_YAGEO-YAGEO-CC1206KKX7RYBB683_C513585.html
footprint CAP-1206 (1206 (3216M) Capacitor)
pins: 1, 2

## CC1206KKX7RZBB102
designator C?  Capacitance: 1nF  (hidden comment: *)
Capacitor, Ceramic (MLCC), 1nF, ±10%, 630V, X7R, ±10%, SMD 1206; Manufacturer: YAGEO; Manufacturer Part Number: CC1206KKX7RZBB102; Package Size: 1206; JLCPCB Basic Part: No; JLCPCB Part Number: C326709; Supplier 1: LCSC; Category: Capacitors - MLCC; Supplier Part Number 1: C326709; Tolerance: ±10%; Voltage Rating: 630V; Temperature Coefficient: X7R; RoHS: Yes; ComponentLink1Description: Datasheet; ComponentLink1URL: https://wmsc.lcsc.com/wmsc/upload/file/pdf/v2/lcsc/1811141240_YAGEO-CC1206KKX7RZBB102_C326709.pdf; ComponentLink2Description: JLCPCB Part URL; ComponentLink2URL: https://jlcpcb.com/partdetail/C326709; ComponentLink3Description: LCSC Part URL; ComponentLink3URL: https://lcsc.com/product-detail/Multilayer-Ceramic-Capacitors-MLCC---SMD-SMT_YAGEO-YAGEO-CC1206KKX7RZBB102_C326709.html
footprint CAP-1206 (1206 (3216M) Capacitor)
pins: 1, 2

## CC1206KKX7RZBB103
designator C?  Capacitance: 10nF  (hidden comment: *)
Capacitor, Ceramic (MLCC), 10nF, ±10%, 630V, X7R, ±10%, SMD 1206; Manufacturer: YAGEO; Manufacturer Part Number: CC1206KKX7RZBB103; Package Size: 1206; JLCPCB Basic Part: No; JLCPCB Part Number: C107201; Supplier 1: LCSC; Category: Capacitors - MLCC; Supplier Part Number 1: C107201; Tolerance: ±10%; Voltage Rating: 630V; Temperature Coefficient: X7R; RoHS: Yes; ComponentLink1Description: Datasheet; ComponentLink1URL: https://wmsc.lcsc.com/wmsc/upload/file/pdf/v2/lcsc/1810241231_YAGEO-CC1206KKX7RZBB103_C107201.pdf; ComponentLink2Description: JLCPCB Part URL; ComponentLink2URL: https://jlcpcb.com/partdetail/C107201; ComponentLink3Description: LCSC Part URL; ComponentLink3URL: https://lcsc.com/product-detail/Multilayer-Ceramic-Capacitors-MLCC---SMD-SMT_YAGEO-YAGEO-CC1206KKX7RZBB103_C107201.html
footprint CAP-1206 (1206 (3216M) Capacitor)
pins: 1, 2

## CC1206KKX7RZBB152
designator C?  Capacitance: 1.5nF  (hidden comment: *)
Capacitor, Ceramic (MLCC), 1.5nF, ±10%, 630V, X7R, ±10%, SMD 1206; Manufacturer: YAGEO; Manufacturer Part Number: CC1206KKX7RZBB152; Package Size: 1206; JLCPCB Basic Part: No; JLCPCB Part Number: C527337; Supplier 1: LCSC; Category: Capacitors - MLCC; Supplier Part Number 1: C527337; Tolerance: ±10%; Voltage Rating: 630V; Temperature Coefficient: X7R; RoHS: Yes; ComponentLink1Description: Datasheet; ComponentLink1URL: https://wmsc.lcsc.com/wmsc/upload/file/pdf/v2/lcsc/2006101835_YAGEO-CC1206KKX7RZBB152_C527337.pdf; ComponentLink2Description: JLCPCB Part URL; ComponentLink2URL: https://jlcpcb.com/partdetail/C527337; ComponentLink3Description: LCSC Part URL; ComponentLink3URL: https://lcsc.com/product-detail/Multilayer-Ceramic-Capacitors-MLCC---SMD-SMT_YAGEO-YAGEO-CC1206KKX7RZBB152_C527337.html
footprint CAP-1206 (1206 (3216M) Capacitor)
pins: 1, 2

## CC1206KKX7RZBB153
designator C?  Capacitance: 15nF  (hidden comment: *)
Capacitor, Ceramic (MLCC), 15nF, ±10%, 630V, X7R, ±10%, SMD 1206; Manufacturer: YAGEO; Manufacturer Part Number: CC1206KKX7RZBB153; Package Size: 1206; JLCPCB Basic Part: No; JLCPCB Part Number: C527338; Supplier 1: LCSC; Category: Capacitors - MLCC; Supplier Part Number 1: C527338; Tolerance: ±10%; Voltage Rating: 630V; Temperature Coefficient: X7R; RoHS: Yes; ComponentLink1Description: Datasheet; ComponentLink1URL: https://wmsc.lcsc.com/wmsc/upload/file/pdf/v2/lcsc/2005261833_YAGEO-CC1206KKX7RZBB153_C527338.pdf; ComponentLink2Description: JLCPCB Part URL; ComponentLink2URL: https://jlcpcb.com/partdetail/C527338; ComponentLink3Description: LCSC Part URL; ComponentLink3URL: https://lcsc.com/product-detail/Multilayer-Ceramic-Capacitors-MLCC---SMD-SMT_YAGEO-YAGEO-CC1206KKX7RZBB153_C527338.html
footprint CAP-1206 (1206 (3216M) Capacitor)
pins: 1, 2

## CC1206KKX7RZBB222
designator C?  Capacitance: 2.2nF  (hidden comment: *)
Capacitor, Ceramic (MLCC), 2.2nF, ±10%, 630V, X7R, ±10%, SMD 1206; Manufacturer: YAGEO; Manufacturer Part Number: CC1206KKX7RZBB222; Package Size: 1206; JLCPCB Basic Part: No; JLCPCB Part Number: C326847; Supplier 1: LCSC; Category: Capacitors - MLCC; Supplier Part Number 1: C326847; Tolerance: ±10%; Voltage Rating: 630V; Temperature Coefficient: X7R; RoHS: Yes; ComponentLink1Description: Datasheet; ComponentLink1URL: https://wmsc.lcsc.com/wmsc/upload/file/pdf/v2/lcsc/1811141224_YAGEO-CC1206KKX7RZBB222_C326847.pdf; ComponentLink2Description: JLCPCB Part URL; ComponentLink2URL: https://jlcpcb.com/partdetail/C326847; ComponentLink3Description: LCSC Part URL; ComponentLink3URL: https://lcsc.com/product-detail/Multilayer-Ceramic-Capacitors-MLCC---SMD-SMT_YAGEO-YAGEO-CC1206KKX7RZBB222_C326847.html
footprint CAP-1206 (1206 (3216M) Capacitor)
pins: 1, 2

## CC1206KKX7RZBB223
designator C?  Capacitance: 22nF  (hidden comment: *)
Capacitor, Ceramic (MLCC), 22nF, ±10%, 630V, X7R, ±10%, SMD 1206; Manufacturer: YAGEO; Manufacturer Part Number: CC1206KKX7RZBB223; Package Size: 1206; JLCPCB Basic Part: No; JLCPCB Part Number: C107202; Supplier 1: LCSC; Category: Capacitors - MLCC; Supplier Part Number 1: C107202; Tolerance: ±10%; Voltage Rating: 630V; Temperature Coefficient: X7R; RoHS: Yes; ComponentLink1Description: Datasheet; ComponentLink1URL: https://wmsc.lcsc.com/wmsc/upload/file/pdf/v2/lcsc/2304140030_YAGEO-CC1206KKX7RZBB223_C107202.pdf; ComponentLink2Description: JLCPCB Part URL; ComponentLink2URL: https://jlcpcb.com/partdetail/C107202; ComponentLink3Description: LCSC Part URL; ComponentLink3URL: https://lcsc.com/product-detail/Multilayer-Ceramic-Capacitors-MLCC---SMD-SMT_YAGEO-YAGEO-CC1206KKX7RZBB223_C107202.html
footprint CAP-1206 (1206 (3216M) Capacitor)
pins: 1, 2

## CC1206KKX7RZBB331
designator C?  Capacitance: 330pF  (hidden comment: *)
Capacitor, Ceramic (MLCC), 330pF, ±10%, 630V, X7R, ±10%, SMD 1206; Manufacturer: YAGEO; Manufacturer Part Number: CC1206KKX7RZBB331; Package Size: 1206; JLCPCB Basic Part: No; JLCPCB Part Number: C469627; Supplier 1: LCSC; Category: Capacitors - MLCC; Supplier Part Number 1: C469627; Tolerance: ±10%; Voltage Rating: 630V; Temperature Coefficient: X7R; RoHS: Yes; ComponentLink1Description: Datasheet; ComponentLink1URL: https://wmsc.lcsc.com/wmsc/upload/file/pdf/v2/lcsc/2304140030_YAGEO-CC1206KKX7RZBB331_C469627.pdf; ComponentLink2Description: JLCPCB Part URL; ComponentLink2URL: https://jlcpcb.com/partdetail/C469627; ComponentLink3Description: LCSC Part URL; ComponentLink3URL: https://lcsc.com/product-detail/Multilayer-Ceramic-Capacitors-MLCC---SMD-SMT_YAGEO-YAGEO-CC1206KKX7RZBB331_C469627.html
footprint CAP-1206 (1206 (3216M) Capacitor)
pins: 1, 2

## CC1206KKX7RZBB332
designator C?  Capacitance: 3.3nF  (hidden comment: *)
Capacitor, Ceramic (MLCC), 3.3nF, ±10%, 630V, X7R, ±10%, SMD 1206; Manufacturer: YAGEO; Manufacturer Part Number: CC1206KKX7RZBB332; Package Size: 1206; JLCPCB Basic Part: No; JLCPCB Part Number: C577228; Supplier 1: LCSC; Category: Capacitors - MLCC; Supplier Part Number 1: C577228; Tolerance: ±10%; Voltage Rating: 630V; Temperature Coefficient: X7R; RoHS: Yes; ComponentLink1Description: Datasheet; ComponentLink1URL: https://wmsc.lcsc.com/wmsc/upload/file/pdf/v2/lcsc/2007201010_YAGEO-CC1206KKX7RZBB332_C577228.pdf; ComponentLink2Description: JLCPCB Part URL; ComponentLink2URL: https://jlcpcb.com/partdetail/C577228; ComponentLink3Description: LCSC Part URL; ComponentLink3URL: https://lcsc.com/product-detail/Multilayer-Ceramic-Capacitors-MLCC---SMD-SMT_YAGEO-YAGEO-CC1206KKX7RZBB332_C577228.html
footprint CAP-1206 (1206 (3216M) Capacitor)
pins: 1, 2

## CC1206KKX7RZBB333
designator C?  Capacitance: 33nF  (hidden comment: *)
Capacitor, Ceramic (MLCC), 33nF, ±10%, 630V, X7R, ±10%, SMD 1206; Manufacturer: YAGEO; Manufacturer Part Number: CC1206KKX7RZBB333; Package Size: 1206; JLCPCB Basic Part: No; JLCPCB Part Number: C577229; Supplier 1: LCSC; Category: Capacitors - MLCC; Supplier Part Number 1: C577229; Tolerance: ±10%; Voltage Rating: 630V; Temperature Coefficient: X7R; RoHS: Yes; ComponentLink1Description: Datasheet; ComponentLink1URL: https://wmsc.lcsc.com/wmsc/upload/file/pdf/v2/lcsc/2304140030_YAGEO-CC1206KKX7RZBB333_C577229.pdf; ComponentLink2Description: JLCPCB Part URL; ComponentLink2URL: https://jlcpcb.com/partdetail/C577229; ComponentLink3Description: LCSC Part URL; ComponentLink3URL: https://lcsc.com/product-detail/Multilayer-Ceramic-Capacitors-MLCC---SMD-SMT_YAGEO-YAGEO-CC1206KKX7RZBB333_C577229.html
footprint CAP-1206 (1206 (3216M) Capacitor)
pins: 1, 2

## CC1206KKX7RZBB471
designator C?  Capacitance: 470pF  (hidden comment: *)
Capacitor, Ceramic (MLCC), 470pF, ±10%, 630V, X7R, ±10%, SMD 1206; Manufacturer: YAGEO; Manufacturer Part Number: CC1206KKX7RZBB471; Package Size: 1206; JLCPCB Basic Part: No; JLCPCB Part Number: C577230; Supplier 1: LCSC; Category: Capacitors - MLCC; Supplier Part Number 1: C577230; Tolerance: ±10%; Voltage Rating: 630V; Temperature Coefficient: X7R; RoHS: Yes; ComponentLink1Description: Datasheet; ComponentLink1URL: https://wmsc.lcsc.com/wmsc/upload/file/pdf/v2/lcsc/2304140030_YAGEO-CC1206KKX7RZBB471_C577230.pdf; ComponentLink2Description: JLCPCB Part URL; ComponentLink2URL: https://jlcpcb.com/partdetail/C577230; ComponentLink3Description: LCSC Part URL; ComponentLink3URL: https://lcsc.com/product-detail/Multilayer-Ceramic-Capacitors-MLCC---SMD-SMT_YAGEO-YAGEO-CC1206KKX7RZBB471_C577230.html
footprint CAP-1206 (1206 (3216M) Capacitor)
pins: 1, 2

## CC1206KKX7RZBB472
designator C?  Capacitance: 4.7nF  (hidden comment: *)
Capacitor, Ceramic (MLCC), 4.7nF, ±10%, 630V, X7R, ±10%, SMD 1206; Manufacturer: YAGEO; Manufacturer Part Number: CC1206KKX7RZBB472; Package Size: 1206; JLCPCB Basic Part: No; JLCPCB Part Number: C326708; Supplier 1: LCSC; Category: Capacitors - MLCC; Supplier Part Number 1: C326708; Tolerance: ±10%; Voltage Rating: 630V; Temperature Coefficient: X7R; RoHS: Yes; ComponentLink1Description: Datasheet; ComponentLink1URL: https://wmsc.lcsc.com/wmsc/upload/file/pdf/v2/lcsc/1811141242_YAGEO-CC1206KKX7RZBB472_C326708.pdf; ComponentLink2Description: JLCPCB Part URL; ComponentLink2URL: https://jlcpcb.com/partdetail/C326708; ComponentLink3Description: LCSC Part URL; ComponentLink3URL: https://lcsc.com/product-detail/Multilayer-Ceramic-Capacitors-MLCC---SMD-SMT_YAGEO-YAGEO-CC1206KKX7RZBB472_C326708.html
footprint CAP-1206 (1206 (3216M) Capacitor)
pins: 1, 2

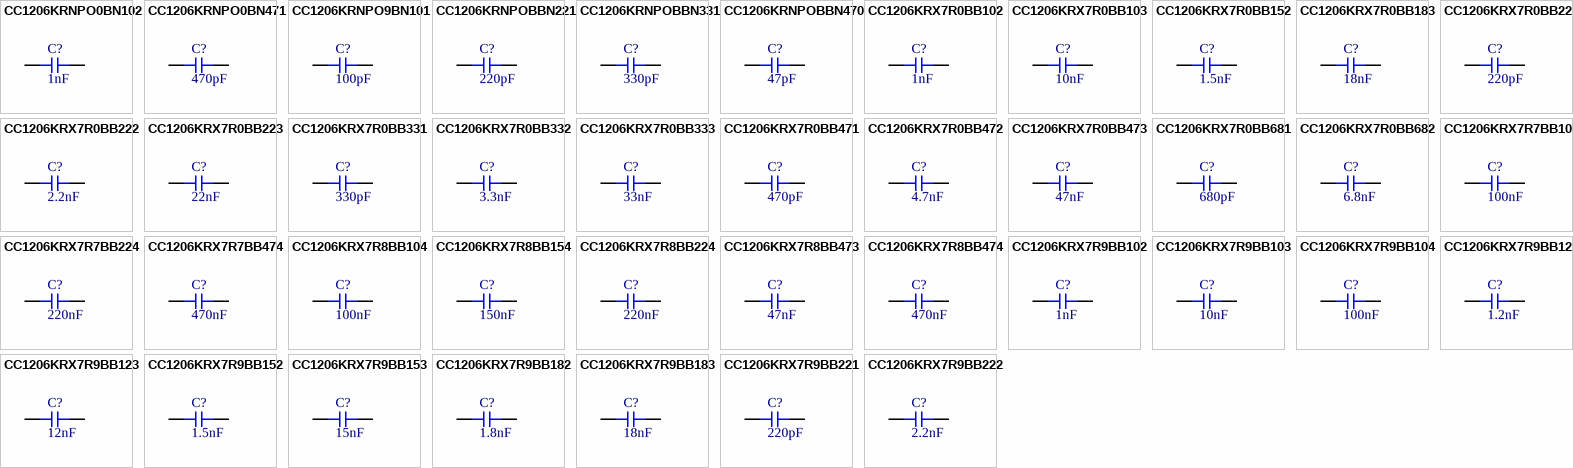
[diagram p32: symbols CC1206KRNPO0BN102 to CC1206KRX7R9BB222]

## CC1206KRNPO0BN102
designator C?  Capacitance: 1nF  (hidden comment: *)
Capacitor, Ceramic (MLCC), 1nF, ±10%, 100V, NP0, ±10%, SMD 1206; Manufacturer: YAGEO; Manufacturer Part Number: CC1206KRNPO0BN102; Package Size: 1206; JLCPCB Basic Part: No; JLCPCB Part Number: C527339; Supplier 1: LCSC; Category: Capacitors - MLCC; Supplier Part Number 1: C527339; Tolerance: ±10%; Voltage Rating: 100V; Temperature Coefficient: NP0; RoHS: Yes; ComponentLink1Description: Datasheet; ComponentLink1URL: https://wmsc.lcsc.com/wmsc/upload/file/pdf/v2/lcsc/2007021837_YAGEO-CC1206KRNPO0BN102_C527339.pdf; ComponentLink2Description: JLCPCB Part URL; ComponentLink2URL: https://jlcpcb.com/partdetail/C527339; ComponentLink3Description: LCSC Part URL; ComponentLink3URL: https://lcsc.com/product-detail/Multilayer-Ceramic-Capacitors-MLCC---SMD-SMT_YAGEO-YAGEO-CC1206KRNPO0BN102_C527339.html
footprint CAP-1206 (1206 (3216M) Capacitor)
pins: 1, 2

## CC1206KRNPO0BN471
designator C?  Capacitance: 470pF  (hidden comment: *)
Capacitor, Ceramic (MLCC), 470pF, ±10%, 100V, NP0, ±10%, SMD 1206; Manufacturer: YAGEO; Manufacturer Part Number: CC1206KRNPO0BN471; Package Size: 1206; JLCPCB Basic Part: No; JLCPCB Part Number: C527340; Supplier 1: LCSC; Category: Capacitors - MLCC; Supplier Part Number 1: C527340; Tolerance: ±10%; Voltage Rating: 100V; Temperature Coefficient: NP0; RoHS: Yes; ComponentLink1Description: Datasheet; ComponentLink1URL: https://wmsc.lcsc.com/wmsc/upload/file/pdf/v2/lcsc/2006181535_YAGEO-CC1206KRNPO0BN471_C527340.pdf; ComponentLink2Description: JLCPCB Part URL; ComponentLink2URL: https://jlcpcb.com/partdetail/C527340; ComponentLink3Description: LCSC Part URL; ComponentLink3URL: https://lcsc.com/product-detail/Multilayer-Ceramic-Capacitors-MLCC---SMD-SMT_YAGEO-YAGEO-CC1206KRNPO0BN471_C527340.html
footprint CAP-1206 (1206 (3216M) Capacitor)
pins: 1, 2